# Altium footprint library Core429IBaseBoardVerE.PcbLib: 35 footprints (part 2 of 3)
Each footprint in its own frame and in the unit in brackets; x right, y up, seen from the top. Pads: shape width x height; smd on the part's side, far side on the other; paste and mask are expansions set on the pad; w line width, h text height; cw(c..) or ccw(c..) is an arc to the next point about the centre after c.
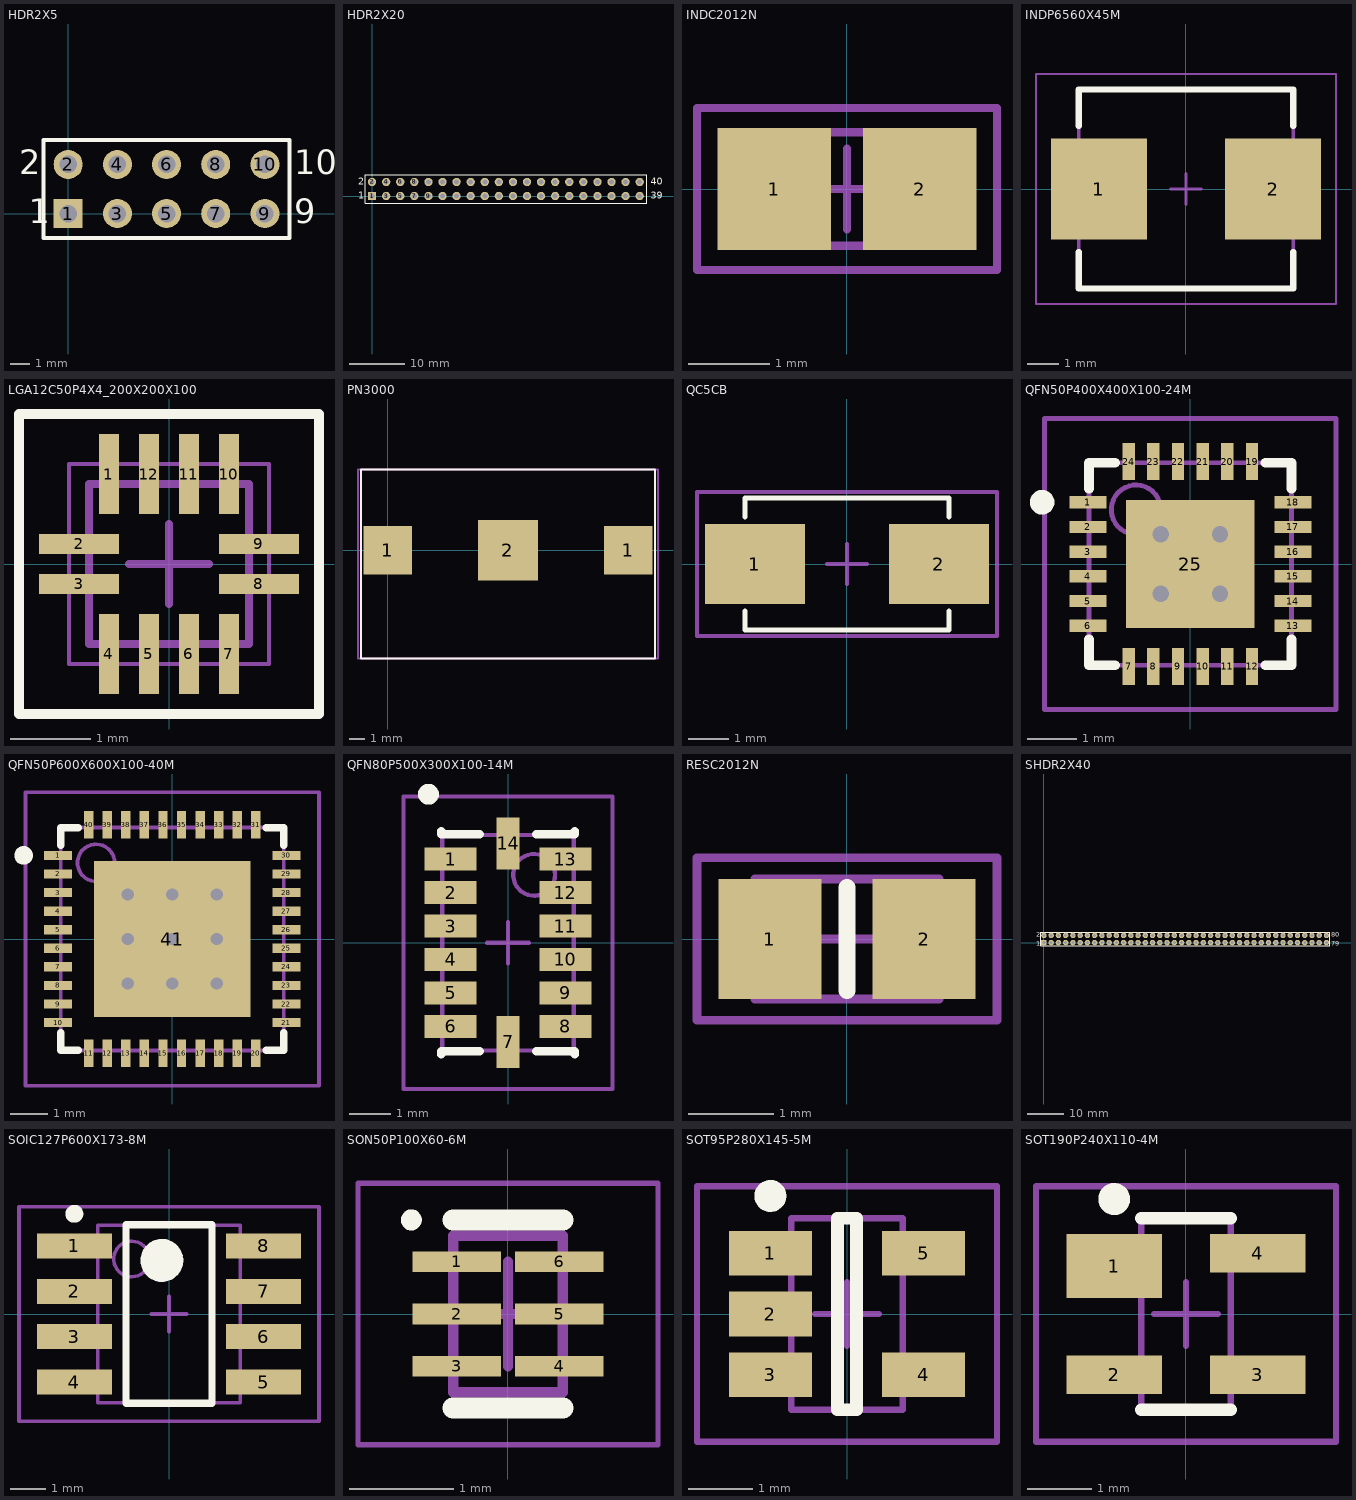
[diagram p1: the footprints below, top view; thin cyan lines are the x and y axes]

## HDR2X5 [mm] "Connector; Header; 5x2 Position"
pads (10):
  rect 1.5x1.5 hole 0.9: 1(0,0)
  round 1.5 hole 0.9: 2(0,2.54) 3(2.54,0) 4(2.54,2.54) 5(5.08,0) 6(5.08,2.54) 7(7.62,0) 8(7.62,2.54) 9(10.16,0) 10(10.16,2.54)
Top Overlay:
  lines w0.2: -1.27,-1.27 -1.27,3.81 11.43,3.81 11.43,-1.27 -1.27,-1.27
  text "2" at -2.54,2.032 h1.27
  text "1" at -2.032,-0.508 h1.27
  text "9" at 11.684,-0.508 h1.27
  text "10" at 11.684,2.032 h1.27
3D body "61301021121.stp": height 8.56, standoff -2.98, extent -1.27,-1.27 11.43,3.81

## HDR2X20 [mm] "Connector; Header; 20x2 Position"
pads (40):
  rect 1.5x1.5 hole 0.9: 1(0,0)
  round 1.5 hole 0.9: 2(0,2.54) 3(2.54,0) 4(2.54,2.54) 5(5.08,0) 6(5.08,2.54) 7(7.62,0) 8(7.62,2.54) 9(10.16,0) 10(10.16,2.54) 11(12.7,0) 12(12.7,2.54) 13(15.24,0) 14(15.24,2.54) 15(17.78,0) 16(17.78,2.54) 17(20.32,0) 18(20.32,2.54) 19(22.86,0) 20(22.86,2.54) 21(25.4,0) 22(25.4,2.54) 23(27.94,0) 24(27.94,2.54) 25(30.48,0) 26(30.48,2.54) 27(33.02,0) 28(33.02,2.54) 29(35.56,0) 30(35.56,2.54) 31(38.1,0) 32(38.1,2.54) 33(40.64,0) 34(40.64,2.54) 35(43.18,0) 36(43.18,2.54) 37(45.72,0) 38(45.72,2.54) 39(48.26,0) 40(48.26,2.54)
Top Overlay:
  lines w0.2: -1.27,-1.27 -1.27,3.81 49.53,3.81 49.53,-1.27 -1.27,-1.27
  text "39" at 50.292,-0.508 h1.27
  text "40" at 50.292,2.032 h1.27
  text "2" at -2.54,2.032 h1.27
  text "1" at -2.54,-0.508 h1.27
3D body "female_header_a-bl254-dg-g40d.stp": height 8.52, standoff -3.18, extent -1.395,-1.23 49.655,3.77

## INDC2012N [mm] "Chip Inductor, Body 2.0x1.2mm, IPC Medium Density"
height 1.1
pads (2):
  rect 1.4x1.5 smd: 1(-0.9,0) 2(0.9,0)
Mechanical 13:
  lines w0.1: -1.1,-0.7 -1.1,0.7 1.1,0.7 1.1,-0.7 -1.1,-0.7
Mechanical 15:
  lines w0.1: -0.5,0 0.5,0 ; 0,-0.5 0,0.5 ; -1.85,-1 -1.85,1 1.85,1 1.85,-1 -1.85,-1
3D body "0805 SMD Inductor.step": height 0.78, standoff 0, extent -1,-0.65 1,0.6

## INDP6560X45M [mm] "Precision Wire Wound Inductor, 2-Leads, Body 6,50x6,00mm, IPC Low Density"
height 4.5
pads (2):
  rect 3.1x3.25 smd: 1(-2.8,0) 2(2.8,0)
Top Overlay:
  lines w0.2: -3.45,-2.025 -3.45,-3.2 3.45,-3.2 3.45,-2.025 ; -3.45,2.025 -3.45,3.2 3.45,3.2 3.45,2.025
Mechanical 13:
  lines w0.1: -3.45,-3.2 -3.45,3.2 3.45,3.2 3.45,-3.2 -3.45,-3.2
Mechanical 15:
  lines w0.05: -4.825,-3.7 -4.825,3.7 4.825,3.7 4.825,-3.7 -4.825,-3.7
  lines w0.1: -0.5,0 0.5,0 ; 0,-0.5 0,0.5
3D body "INDP6560X45M.step": height 4.6, standoff 0, extent -3.35,-3 3.35,3

## LGA12C50P4X4_200X200X100 [mm] "LGA, 12-Leads, Body 2,00x2,00mmx1,00mm, Pitch 0,50mm"
height 1
pads (12):
  rect 0.25x1 smd: 1(-0.75,1.125) 4(-0.75,-1.125) 5(-0.25,-1.125) 6(0.25,-1.125) 7(0.75,-1.125) 10(0.75,1.125) 11(0.25,1.125) 12(-0.25,1.125)
  rect 1x0.25 smd: 2(-1.125,0.25) 3(-1.125,-0.25) 8(1.125,-0.25) 9(1.125,0.25)
Top Overlay:
  lines w0.127: -1.875,-1.875 1.875,-1.875 1.875,1.875 -1.875,1.875 -1.875,-1.875
Mechanical 13:
  lines w0.1: -1,-1 1,-1 1,1 -1,1 -1,-1
Mechanical 15:
  lines w0.05: -1.25,-1.25 1.25,-1.25 1.25,1.25 -1.25,1.25 -1.25,-1.25
  lines w0.1: -0.5,0 0.5,0 ; 0,-0.5 0,0.5
3D body "LGA12C50P4X4_200X200X100.step": height 1, standoff 0, extent -1.075,-1.075 1.075,1.075

## PN3000 [mm] "12mm SM Coin Cell Clip"
height 3.18
pads (3):
  rect 3.18x3.18 smd: 1(0,0) 1(15.74,0)
  rect 3.96x3.96 smd: 2(7.87,0)
Top Overlay:
  lines w0.127: -1.75,-7.075 17.5,-7.075 17.5,5.275 -1.75,5.275 -1.75,-7.075
Mechanical 15:
  lines w0.127: -1.95,-7.075 -1.95,5.275 17.69,5.275 17.69,-7.075 -1.95,-7.075
3D body "keystone-PN3000.STEP": height 3.19, standoff 0.02, extent -1.599,-6.925 17.349,5.14

## QC5CB [mm] "3.2x5.0 2-Pad SMD All Ceramic Crystal Unit"
height 1.1
pads (2):
  rect 2.5x2 smd: 1(-2.3,0) 2(2.3,0)
Top Overlay:
  lines w0.127: -2.55,-1.175 -2.55,-1.65 2.55,-1.65 2.55,-1.175 ; -2.55,1.175 -2.55,1.65 2.55,1.65 2.55,1.175
Mechanical 15:
  lines w0.1: -0.5,0 0.5,0 ; 0,-0.5 0,0.5 ; -3.75,-1.8 3.75,-1.8 3.75,1.8 -3.75,1.8 -3.75,-1.8
3D body "ABM3-1.STEP": height 1.32, standoff 0.02, extent -2.5,-1.6 2.5,1.6

## QFN50P400X400X100-24M [mm] "QFN, 24-Leads, Body 4,1x4,1mm (max), Pitch 0,50mm, IPC Low Density"
height 1
pads (25):
  rect 0.75x0.25 smd: 1(-2.075,1.25) 2(-2.075,0.75) 3(-2.075,0.25) 4(-2.075,-0.25) 5(-2.075,-0.75) 6(-2.075,-1.25) 13(2.075,-1.25) 14(2.075,-0.75) 15(2.075,-0.25) 16(2.075,0.25) 17(2.075,0.75) 18(2.075,1.25)
  rect 0.25x0.75 smd: 7(-1.25,-2.075) 8(-0.75,-2.075) 9(-0.25,-2.075) 10(0.25,-2.075) 11(0.75,-2.075) 12(1.25,-2.075) 19(1.25,2.075) 20(0.75,2.075) 21(0.25,2.075) 22(-0.25,2.075) 23(-0.75,2.075) 24(-1.25,2.075)
  rect 2.6x2.6 smd: 25(0,0)
via 0.6,-0.6 diameter 0.66 hole 0.33
via -0.6,-0.6 diameter 0.66 hole 0.33
via 0.6,0.6 diameter 0.66 hole 0.33
via -0.6,0.6 diameter 0.66 hole 0.33
Top Overlay:
  circle w0.25: c-3,1.25 r0.125
  lines w0.2: -2.05,-1.525 -2.05,-2.05 -1.525,-2.05 ; -2.05,1.525 -2.05,2.05 -1.525,2.05 ; 1.525,-2.05 2.05,-2.05 2.05,-1.525 ; 1.525,2.05 2.05,2.05 2.05,1.525
Mechanical 13:
  circle w0.1: c-1.1,1.1 r0.5
  lines w0.1: -2.05,-2.05 2.05,-2.05 2.05,2.05 -2.05,2.05 -2.05,-2.05
Mechanical 15:
  lines w0.1: -0.5,0 0.5,0 ; 0,-0.5 0,0.5 ; -2.95,-2.95 2.95,-2.95 2.95,2.95 -2.95,2.95 -2.95,-2.95
3D body "QFN24_4x4.STEP": height 1, standoff 0, extent -2.01,-2.01 2.01,2.01

## QFN50P600X600X100-40M [mm] "QFN, 40-Leads, Body 6,0x6,0mm (max), Pitch 0,50mm, IPC Low Density"
height 1
pads (41):
  rect 0.75x0.25 smd: 1(-3.075,2.25) 2(-3.075,1.75) 3(-3.075,1.25) 4(-3.075,0.75) 5(-3.075,0.25) 6(-3.075,-0.25) 7(-3.075,-0.75) 8(-3.075,-1.25) 9(-3.075,-1.75) 10(-3.075,-2.25) 21(3.075,-2.25) 22(3.075,-1.75) 23(3.075,-1.25) 24(3.075,-0.75) 25(3.075,-0.25) 26(3.075,0.25) 27(3.075,0.75) 28(3.075,1.25) 29(3.075,1.75) 30(3.075,2.25)
  rect 0.25x0.75 smd: 11(-2.25,-3.075) 12(-1.75,-3.075) 13(-1.25,-3.075) 14(-0.75,-3.075) 15(-0.25,-3.075) 16(0.25,-3.075) 17(0.75,-3.075) 18(1.25,-3.075) 19(1.75,-3.075) 20(2.25,-3.075) 31(2.25,3.075) 32(1.75,3.075) 33(1.25,3.075) 34(0.75,3.075) 35(0.25,3.075) 36(-0.25,3.075) 37(-0.75,3.075) 38(-1.25,3.075) 39(-1.75,3.075) 40(-2.25,3.075)
  rect 4.2x4.2 smd: 41(0,0)
via 1.2,-1.2 diameter 0.66 hole 0.33
via 0,-1.2 diameter 0.66 hole 0.33
via -1.2,-1.2 diameter 0.66 hole 0.33
via 1.2,0 diameter 0.66 hole 0.33
via 0,0 diameter 0.66 hole 0.33
via -1.2,0 diameter 0.66 hole 0.33
via 1.2,1.2 diameter 0.66 hole 0.33
via 0,1.2 diameter 0.66 hole 0.33
via -1.2,1.2 diameter 0.66 hole 0.33
Top Overlay:
  circle w0.25: c-4,2.25 r0.125
  lines w0.2: -3,-2.525 -3,-3 -2.525,-3 ; -3,2.525 -3,3 -2.525,3 ; 2.525,-3 3,-3 3,-2.525 ; 2.525,3 3,3 3,2.525
Mechanical 13:
  circle w0.1: c-2.05,2.05 r0.5
  lines w0.1: -3,-3 3,-3 3,3 -3,3 -3,-3
Mechanical 15:
  lines w0.1: -0.5,0 0.5,0 ; 0,-0.5 0,0.5 ; -3.95,-3.95 3.95,-3.95 3.95,3.95 -3.95,3.95 -3.95,-3.95
3D body "QFN-40.STEP": height 1.07, standoff 0.02, extent -3.075,-3.085 3.075,3.065

## QFN80P500X300X100-14M [mm] "QFN, 14-Leads, Body 3,2x5,2mm (max), Pitch 0,80mm, IPC Low Density"
height 1
pads (14):
  rect 1.25x0.55 smd: 1(-1.375,2) 2(-1.375,1.2) 3(-1.375,0.4) 4(-1.375,-0.4) 5(-1.375,-1.2) 6(-1.375,-2) 8(1.375,-2) 9(1.375,-1.2) 10(1.375,-0.4) 11(1.375,0.4) 12(1.375,1.2) 13(1.375,2)
  rect 0.55x1.25 smd: 7(0,-2.375) 14(0,2.375)
Top Overlay:
  circle w0.25: c-1.905,3.554 r0.125
  lines w0.2: -1.6,-2.675 -1.6,-2.6 -0.675,-2.6 ; -1.6,2.675 -1.6,2.6 -0.675,2.6 ; 0.675,-2.6 1.6,-2.6 1.6,-2.675 ; 0.675,2.6 1.6,2.6 1.6,2.675
Mechanical 13:
  circle w0.1: c0.625,1.625 r0.5
  lines w0.1: -1.575,-2.575 1.575,-2.575 1.575,2.575 -1.575,2.575 -1.575,-2.575
Mechanical 15:
  lines w0.1: -0.5,0 0.5,0 ; 0,-0.5 0,0.5 ; -2.5,-3.5 2.5,-3.5 2.5,3.5 -2.5,3.5 -2.5,-3.5
3D body "LGA-14.STEP": height 1.03, standoff -0.4, extent -1.505,-2.51 1.495,2.49

## RESC2012N [mm] "Chip Resistor, Body 2.0x1.3mm, IPC Medium Density"
height 0.65
pads (2):
  rect 1.2x1.4 smd: 1(-0.9,0) 2(0.9,0)
Top Overlay:
  lines w0.2: 0,-0.6 0,0.6
Mechanical 13:
  lines w0.1: -1.075,-0.7 1.075,-0.7 1.075,0.7 -1.075,0.7 -1.075,-0.7
Mechanical 15:
  lines w0.1: -0.5,0 0.5,0 ; 0,-0.5 0,0.5 ; -1.75,-0.95 1.75,-0.95 1.75,0.95 -1.75,0.95 -1.75,-0.95
3D body "0805 SMD Resistor.step": height 0.62, standoff 0.02, extent -0.975,-0.625 1.025,0.625

## SHDR2X40 [mm] "Connector; Header; 40x2 Position"
pads (80):
  rect 1.5x1.5 hole 0.79: 1(0,0)
  round 1.5 hole 0.79: 2(0,2) 3(2,0) 4(2,2) 5(4,0) 6(4,2) 7(6,0) 8(6,2) 9(8,0) 10(8,2) 11(10,0) 12(10,2) 13(12,0) 14(12,2) 15(14,0) 16(14,2) 17(16,0) 18(16,2) 19(18,0) 20(18,2) 21(20,0) 22(20,2) 23(22,0) 24(22,2) 25(24,0) 26(24,2) 27(26,0) 28(26,2) 29(28,0) 30(28,2) 31(30,0) 32(30,2) 33(32,0) 34(32,2) 35(34,0) 36(34,2) 37(36,0) 38(36,2) 39(38,0) 40(38,2) 41(40,0) 42(40,2) 43(42,0) 44(42,2) 45(44,0) 46(44,2) 47(46,0) 48(46,2) 49(48,0) 50(48,2) 51(50,0) 52(50,2) 53(52,0) 54(52,2) 55(54,0) 56(54,2) 57(56,0) 58(56,2) 59(58,0) 60(58,2) 61(60,0) 62(60,2) 63(62,0) 64(62,2) 65(64,0) 66(64,2) 67(66,0) 68(66,2) 69(68,0) 70(68,2) 71(70,0) 72(70,2) 73(72,0) 74(72,2) 75(74,0) 76(74,2) 77(76,0) 78(76,2) 79(78,0) 80(78,2)
Top Overlay:
  lines w0.127: -0.92,-0.92 78.92,-0.92 78.92,2.92 -0.92,2.92 -0.92,-0.92
  text "2" at -2.19,1.607 h1.27
  text "1" at -2.19,-0.883 h1.27
  text "80" at 79.357,1.607 h1.27
  text "79" at 79.357,-0.883 h1.27
3D body "female_header_a-bl200-dg-g80d.stp": height 4.02, standoff -2.78, extent -1.246,-1.227 79.254,3.273

## SOIC127P600X173-8M [mm] "SOIC, 8-Leads, Body 5,0x4,0mm (max), Pitch 1,27mm, IPC Low Density"
height 1.73
pads (8):
  rect 2.1x0.7 smd: 1(-2.65,1.905) 2(-2.65,0.635) 3(-2.65,-0.635) 4(-2.65,-1.905) 5(2.65,-1.905) 6(2.65,-0.635) 7(2.65,0.635) 8(2.65,1.905)
Top Overlay:
  circle w0.6: c-0.2,1.5 r0.3
  circle w0.25: c-2.65,2.805 r0.125
  lines w0.2: -1.2,-2.5 1.2,-2.5 1.2,2.5 -1.2,2.5 -1.2,-2.5
Mechanical 13:
  circle w0.1: c-1.045,1.54 r0.5
  lines w0.1: -1.995,-2.49 1.995,-2.49 1.995,2.49 -1.995,2.49 -1.995,-2.49
Mechanical 15:
  lines w0.1: -0.5,0 0.5,0 ; 0,-0.5 0,0.5 ; -4.2,-3 4.2,-3 4.2,3 -4.2,3 -4.2,-3
3D body "SOIC-8.stp": height 1.75, standoff 0, extent -3.025,-2.535 3.055,2.465

## SON50P100X60-6M [mm] "SON, 6-Leads, Body 1,45x1,00mm, Pitch 0,50mm, IPC Low Density"
height 0.6
pads (6):
  rect 0.85x0.2 smd: 1(-0.49,0.5) 2(-0.49,0) 3(-0.49,-0.5) 4(0.49,-0.5) 5(0.49,0) 6(0.49,0.5)
Top Overlay:
  circle w0.1: c-0.925,0.9 r0.05
  lines w0.2: -0.525,-0.9 0.525,-0.9 ; -0.525,0.9 0.525,0.9
Mechanical 13:
  lines w0.1: -0.525,-0.75 -0.525,0.75 0.525,0.75 0.525,-0.75 -0.525,-0.75
Mechanical 15:
  lines w0.05: -1.435,-1.25 -1.435,1.25 1.435,1.25 1.435,-1.25 -1.435,-1.25
  lines w0.1: -0.5,0 0.5,0 ; 0,-0.5 0,0.5
3D body "SON50P100X60-6M.step": height 0.6, standoff 0, extent -0.575,-0.75 0.575,0.75

## SOT95P280X145-5M [mm] "SOT23, 5-Leads, Body 3,0x3,0mm (max), Pitch 0,95mm, IPC Low Density"
height 1.45
pads (5):
  rect 1.3x0.7 smd: 1(-1.2,0.95) 2(-1.2,0) 3(-1.2,-0.95) 4(1.2,-0.95) 5(1.2,0.95)
Top Overlay:
  circle w0.25: c-1.2,1.85 r0.125
  lines w0.2: -0.15,-1.5 0.15,-1.5 0.15,1.5 -0.15,1.5 -0.15,-1.5
Mechanical 13:
  lines w0.1: -0.875,-1.5 -0.875,1.5 0.875,1.5 0.875,-1.5 -0.875,-1.5
Mechanical 15:
  lines w0.1: -0.5,0 0.5,0 ; 0,-0.5 0,0.5 ; -2.35,-2 -2.35,2 2.35,2 2.35,-2 -2.35,-2
3D body "MO-178AA.stp": height 1.45, standoff 0, extent -1.475,-1.494 1.525,1.505

## SOT190P240X110-4M [mm] "SOT143, 4-Leads, Body 3,0x2,5mm (max), Pitch 1,90mm, IPC Low Density"
height 1.1
pads (4):
  rect 1.5x1 smd: 1(-1.125,0.75)
  rect 1.5x0.6 smd: 2(-1.125,-0.95) 3(1.125,-0.95) 4(1.125,0.95)
Top Overlay:
  circle w0.25: c-1.125,1.8 r0.125
  lines w0.2: -0.7,-1.5 0.7,-1.5 ; -0.7,1.5 0.7,1.5
Mechanical 13:
  lines w0.1: -0.7,-1.5 0.7,-1.5 0.7,1.5 -0.7,1.5 -0.7,-1.5
Mechanical 15:
  lines w0.1: -0.5,0 0.5,0 ; 0,-0.5 0,0.5 ; -2.35,-2 2.35,-2 2.35,2 -2.35,2 -2.35,-2
3D body "sot143.step": height 1.02, standoff 0.02, extent -1.21,-1.46 1.21,1.46